# Altium footprint library Components.PcbLib: 68 footprints (part 3 of 5)
Each footprint in its own frame and in the unit in brackets; x right, y up, seen from the top. Pads: shape width x height; smd on the part's side, far side on the other; paste and mask are expansions set on the pad; w line width, h text height; cw(c..) or ccw(c..) is an arc to the next point about the centre after c.
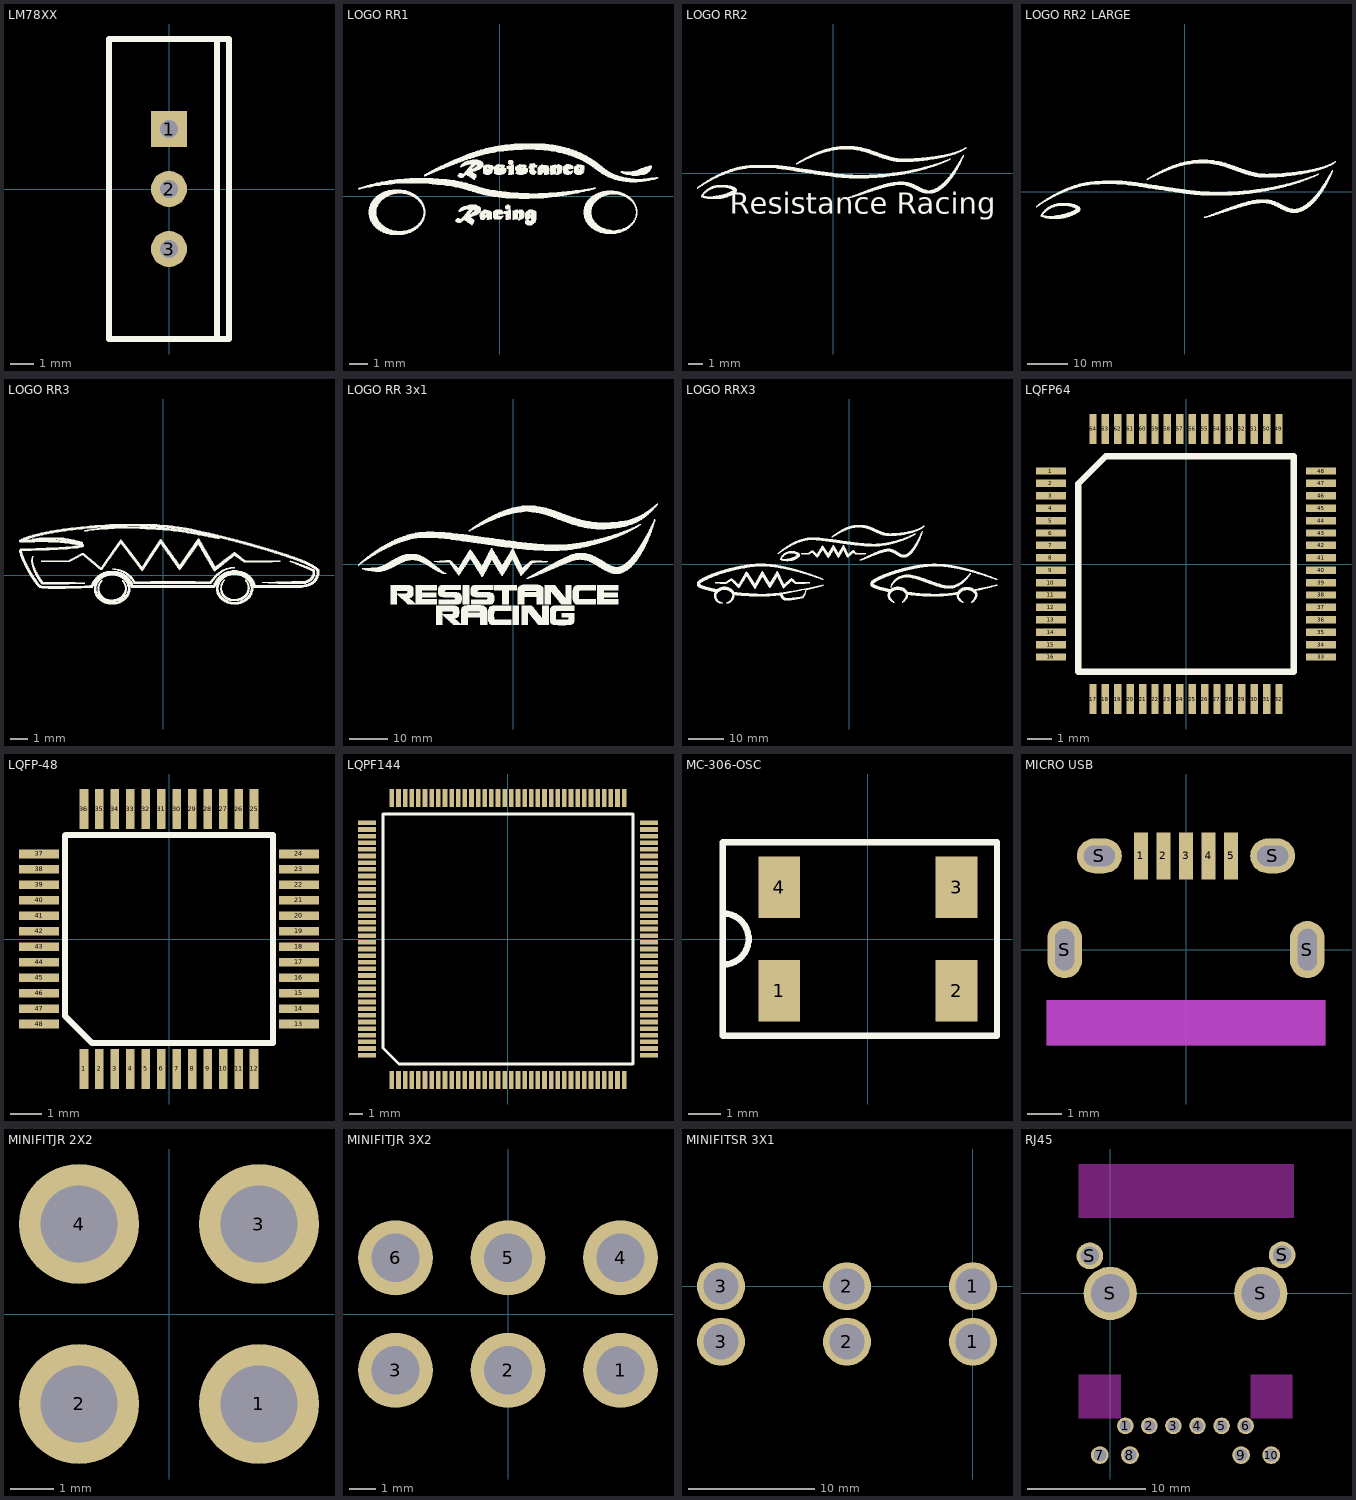
[diagram p2: the footprints below, top view; thin cyan lines are the x and y axes]

## LM78XX [mil] "LM78XX Voltage Reg"
height 250
pads (3):
  rect 60x60 hole 30: 1(0,100)
  round 60 hole 30: 2(0,0) 3(0,-100)
Top Overlay:
  lines w10: 80,-250 80,250 ; -100,-250 100,-250 100,250 -100,250 -100,-250

## LOGO RR1 [mm]
Top Overlay:
  drawing of 1512 lines, arcs and shapes, not listed

## LOGO RR2 [mm]
Top Overlay:
  drawing of 641 lines, arcs and shapes, not listed
  text "Resistance Racing" at -7.188,-3.327 h2.54

## LOGO RR2 LARGE [mm]
Top Overlay:
  drawing of 641 lines, arcs and shapes, not listed

## LOGO RR3 [mm]
Top Overlay:
  drawing of 2040 lines, arcs and shapes, not listed

## LOGO RR 3x1 [mm]
Top Overlay:
  drawing of 2692 lines, arcs and shapes, not listed

## LOGO RRX3 [mm]
Top Overlay:
  drawing of 2848 lines, arcs and shapes, not listed

## LQFP64 [mm]
pads (64):
  rect 1.2x0.3 smd: 1(-5.45,3.75) 2(-5.45,3.25) 3(-5.45,2.75) 4(-5.45,2.25) 5(-5.45,1.75) 6(-5.45,1.25) 7(-5.45,0.75) 8(-5.45,0.25) 9(-5.45,-0.25) 10(-5.45,-0.75) 11(-5.45,-1.25) 12(-5.45,-1.75) 13(-5.45,-2.25) 14(-5.45,-2.75) 15(-5.45,-3.25) 16(-5.45,-3.75) 33(5.45,-3.75) 34(5.45,-3.25) 35(5.45,-2.75) 36(5.45,-2.25) 37(5.45,-1.75) 38(5.45,-1.25) 39(5.45,-0.75) 40(5.45,-0.25) 41(5.45,0.25) 42(5.45,0.75) 43(5.45,1.25) 44(5.45,1.75) 45(5.45,2.25) 46(5.45,2.75) 47(5.45,3.25) 48(5.45,3.75)
  rect 0.3x1.2 smd: 17(-3.75,-5.45) 18(-3.25,-5.45) 19(-2.75,-5.45) 20(-2.25,-5.45) 21(-1.75,-5.45) 22(-1.25,-5.45) 23(-0.75,-5.45) 24(-0.25,-5.45) 25(0.25,-5.45) 26(0.75,-5.45) 27(1.25,-5.45) 28(1.75,-5.45) 29(2.25,-5.45) 30(2.75,-5.45) 31(3.25,-5.45) 32(3.75,-5.45) 49(3.75,5.45) 50(3.25,5.45) 51(2.75,5.45) 52(2.25,5.45) 53(1.75,5.45) 54(1.25,5.45) 55(0.75,5.45) 56(0.25,5.45) 57(-0.25,5.45) 58(-0.75,5.45) 59(-1.25,5.45) 60(-1.75,5.45) 61(-2.25,5.45) 62(-2.75,5.45) 63(-3.25,5.45) 64(-3.75,5.45)
Top Overlay:
  lines w0.254: -4.342,-4.342 4.342,-4.342 4.342,4.342 -3.234,4.342 -4.342,3.234 -4.342,-4.342
3D body: height 1.6, standoff 0, extent -6,-6 6,6

## LQFP-48 [mm] "Specifically: PT (S-PQFP-G48)"
pads (48):
  rect 0.28x1.3 smd: 1(-2.75,-4.2) 2(-2.25,-4.2) 3(-1.75,-4.2) 4(-1.25,-4.2) 5(-0.75,-4.2) 6(-0.25,-4.2) 7(0.25,-4.2) 8(0.75,-4.2) 9(1.25,-4.2) 10(1.75,-4.2) 11(2.25,-4.2) 12(2.75,-4.2) 25(2.75,4.2) 26(2.25,4.2) 27(1.75,4.2) 28(1.25,4.2) 29(0.75,4.2) 30(0.25,4.2) 31(-0.25,4.2) 32(-0.75,4.2) 33(-1.25,4.2) 34(-1.75,4.2) 35(-2.25,4.2) 36(-2.75,4.2)
  rect 1.3x0.28 smd: 13(4.2,-2.75) 14(4.2,-2.25) 15(4.2,-1.75) 16(4.2,-1.25) 17(4.2,-0.75) 18(4.2,-0.25) 19(4.2,0.25) 20(4.2,0.75) 21(4.2,1.25) 22(4.2,1.75) 23(4.2,2.25) 24(4.2,2.75) 37(-4.2,2.75) 38(-4.2,2.25) 39(-4.2,1.75) 40(-4.2,1.25) 41(-4.2,0.75) 42(-4.2,0.25) 43(-4.2,-0.25) 44(-4.2,-0.75) 45(-4.2,-1.25) 46(-4.2,-1.75) 47(-4.2,-2.25) 48(-4.2,-2.75)
Top Overlay:
  lines w0.2: -3.365,3.35 -3.365,-2.485 -2.485,-3.365 3.365,-3.365 3.365,3.365 -3.35,3.365
3D body: height 1.6, standoff 0, extent -4.5,-4.5 4.5,4.5

## LQPF144 [mm]
pads (144):
  rect 0.35x1.35 smd: 1(-8.75,-10.625) 2(-8.25,-10.625) 3(-7.75,-10.625) 4(-7.25,-10.625) 5(-6.75,-10.625) 6(-6.25,-10.625) 7(-5.75,-10.625) 8(-5.25,-10.625) 9(-4.75,-10.625) 10(-4.25,-10.625) 11(-3.75,-10.625) 12(-3.25,-10.625) 13(-2.75,-10.625) 14(-2.25,-10.625) 15(-1.75,-10.625) 16(-1.25,-10.625) 17(-0.75,-10.625) 18(-0.25,-10.625) 19(0.25,-10.625) 20(0.75,-10.625) 21(1.25,-10.625) 22(1.75,-10.625) 23(2.25,-10.625) 24(2.75,-10.625) 25(3.25,-10.625) 26(3.75,-10.625) 27(4.25,-10.625) 28(4.75,-10.625) 29(5.25,-10.625) 30(5.75,-10.625) 31(6.25,-10.625) 32(6.75,-10.625) 33(7.25,-10.625) 34(7.75,-10.625) 35(8.25,-10.625) 36(8.75,-10.625) 73(8.75,10.625) 74(8.25,10.625) 75(7.75,10.625) 76(7.25,10.625) 77(6.75,10.625) 78(6.25,10.625) 79(5.75,10.625) 80(5.25,10.625) 81(4.75,10.625) 82(4.25,10.625) 83(3.75,10.625) 84(3.25,10.625) 85(2.75,10.625) 86(2.25,10.625) 87(1.75,10.625) 88(1.25,10.625) 89(0.75,10.625) 90(0.25,10.625) 91(-0.25,10.625) 92(-0.75,10.625) 93(-1.25,10.625) 94(-1.75,10.625) 95(-2.25,10.625) 96(-2.75,10.625) 97(-3.25,10.625) 98(-3.75,10.625) 99(-4.25,10.625) 100(-4.75,10.625) 101(-5.25,10.625) 102(-5.75,10.625) 103(-6.25,10.625) 104(-6.75,10.625) 105(-7.25,10.625) 106(-7.75,10.625) 107(-8.25,10.625) 108(-8.75,10.625)
  rect 1.35x0.35 smd: 37(10.625,-8.75) 38(10.625,-8.25) 39(10.625,-7.75) 40(10.625,-7.25) 41(10.625,-6.75) 42(10.625,-6.25) 43(10.625,-5.75) 44(10.625,-5.25) 45(10.625,-4.75) 46(10.625,-4.25) 47(10.625,-3.75) 48(10.625,-3.25) 49(10.625,-2.75) 50(10.625,-2.25) 51(10.625,-1.75) 52(10.625,-1.25) 53(10.625,-0.75) 54(10.625,-0.25) 55(10.625,0.25) 56(10.625,0.75) 57(10.625,1.25) 58(10.625,1.75) 59(10.625,2.25) 60(10.625,2.75) 61(10.625,3.25) 62(10.625,3.75) 63(10.625,4.25) 64(10.625,4.75) 65(10.625,5.25) 66(10.625,5.75) 67(10.625,6.25) 68(10.625,6.75) 69(10.625,7.25) 70(10.625,7.75) 71(10.625,8.25) 72(10.625,8.75) 109(-10.625,8.75) 110(-10.625,8.25) 111(-10.625,7.75) 112(-10.625,7.25) 113(-10.625,6.75) 114(-10.625,6.25) 115(-10.625,5.75) 116(-10.625,5.25) 117(-10.625,4.75) 118(-10.625,4.25) 119(-10.625,3.75) 120(-10.625,3.25) 121(-10.625,2.75) 122(-10.625,2.25) 123(-10.625,1.75) 124(-10.625,1.25) 125(-10.625,0.75) 126(-10.625,0.25) 127(-10.625,-0.25) 128(-10.625,-0.75) 129(-10.625,-1.25) 130(-10.625,-1.75) 131(-10.625,-2.25) 132(-10.625,-2.75) 133(-10.625,-3.25) 134(-10.625,-3.75) 135(-10.625,-4.25) 136(-10.625,-4.75) 137(-10.625,-5.25) 138(-10.625,-5.75) 139(-10.625,-6.25) 140(-10.625,-6.75) 141(-10.625,-7.25) 142(-10.625,-7.75) 143(-10.625,-8.25) 144(-10.625,-8.75)
Top Overlay:
  lines w0.2: -9.415,-8.205 -8.205,-9.415 9.415,-9.415 9.415,9.415 -9.415,9.415 -9.415,-8.205
3D body: height 0.65, standoff 0, extent -9.398,-9.398 9.398,9.398

## MC-306-OSC [mm]
pads (4):
  rect 1.3x1.9 smd: 1(-2.75,-1.6) 2(2.75,-1.6) 3(2.75,1.6) 4(-2.75,1.6)
Top Overlay:
  lines w0.2: -4.5,-0.8 ccw(c-4.5,0) -4.5,0.8 ; -4.5,-3 4,-3 4,3 -4.5,3 -4.5,-3

## MICRO USB [mm]
pads (9):
  rect 0.4x1.35 smd mask+0.025: 1(-1.3,2.7) 2(-0.65,2.7) 3(0,2.7) 4(0.65,2.7) 5(1.3,2.7)
  oval 1x1.65 hole 0.55 slot 1.2 at 90 deg: S(-3.5,0) S(3.5,0)
  oval 1.3x1 hole 0.6 slot 0.9 at 0 deg mask+0.051: S(-2.5,2.7) S(2.5,2.7)
Mechanical 13 keep-out:
  rectangle: -4.025,-2.765 4.025,-1.45
3D body: height 2.74, standoff -0.53, extent -4.025,-2.667 4.025,2.913

## MINIFITJR 2X2 [mil]
pads (4):
  round 110 hole 71: 1(82.5,-82.5) 2(-82.5,-82.5) 3(82.5,82.5) 4(-82.5,82.5)
via 267.5,90 diameter 160 hole 118
via -267.5,90 diameter 160 hole 118
3D body: height 537.72, standoff -141.81, extent -327.95,-195.97 327.96,237.1

## MINIFITJR 3X2 [mil]
pads (6):
  round 110 hole 71: 1(165,-82.5) 2(0,-82.5) 3(-165,-82.5) 4(165,82.5) 5(0,82.5) 6(-165,82.5)
via 350,90 diameter 160 hole 118
via -350,90 diameter 160 hole 118
3D body: height 537.72, standoff -141.81, extent -410.62,-195.97 410.64,237.1

## MINIFITSR 3X1 [mil]
pads (6):
  round 150 hole 110: 1(0,-173) 1(0,0) 2(-393.7,-173) 2(-393.7,0) 3(-787.4,-173) 3(-787.4,0)
via -1012.99,-159 diameter 160 hole 118
via 226,-159 diameter 160 hole 118
3D body: height 819.01, standoff -147.52, extent -1059.74,-379.56 271.75,175.56

## RJ45 [mm]
pads (14):
  round 1.4 hole 1: 1(1.27,-11.17) 2(3.3,-11.17) 3(5.33,-11.17) 4(7.36,-11.17) 5(9.39,-11.17) 6(11.42,-11.17)
  round 1.5 hole 1.1: 7(-0.88,-13.64) 8(1.66,-13.64) 9(11.04,-13.64) 10(13.58,-13.64)
  round 2.25 hole 1.57: S(-1.72,3.17) S(14.5,3.25)
  round 4.5 hole 3.25: S(0,0) S(12.7,0)
Keep-Out Layer:
  rectangle: -2.667,6.35 15.494,10.922
  rectangle: -2.667,-10.541 0.889,-6.858
  rectangle: 11.811,-10.541 15.367,-6.858
3D body: height 13.49, standoff 0, extent -1.803,-14.605 14.503,10.922